# Altium footprint library 6-Connectors-3.PcbLib: 153 footprints (part 9 of 11) (continued)
## TYCO_350711-1 [mm] "6 Circuits Mini-Universal MATE-N-LOK Connector" (continued)
  text "1" at -11.055,-3.765 h1.2
  text "4" at -11.605,2.61 h1.2
  text "6" at 10.78,2.64 h1.2
  text "3" at 10.78,-3.71 h1.2
3D body "TYCO_350711-1.stp": height 14.82, standoff -3.56, extent -11.43,-9.525 11.43,9.525

## TYCO_350712-1 [mm] "9 Circuits Mini-Universal MATE-N-LOK Connector"
height 14.73
pads (9):
  round 2.5 hole 1.8: 1(-6.35,6.35) 2(-6.35,0) 3(-6.35,-6.35) 4(0,6.35) 5(0,0) 6(0,-6.35) 7(6.35,6.35) 8(6.35,0) 9(6.35,-6.35)
Top Overlay:
  circle w0.2: c-6.35,0.032 r3.016
  circle w0.2: c6.35,6.382 r3.016
  circle w0.2: c6.35,-6.318 r3.016
  circle w0.2: c0,-6.318 r3.016
  circle w0.2: c0,0.032 r3.016
  circle w0.2: c0,6.382 r3.016
  lines w0.2: -10.16,-1.956 -12.7,-1.956 -12.7,1.981 -10.16,1.981 ; 10.16,-1.981 12.7,-1.981 12.7,1.956 10.16,1.956 ; -10.16,-11.43 -8.89,-11.43 -8.89,-10.16 -3.81,-10.16 -3.81,-11.43 -2.54,-11.43 -2.54,-10.16 2.54,-10.16 2.54,-11.43 3.81,-11.43 3.81,-10.16 8.89,-10.16 8.89,-11.43 10.16,-11.43 10.16,11.43 8.89,11.43 8.89,10.16 3.81,10.16 3.81,11.43 2.54,11.43 2.54,10.16 -2.54,10.16 -2.54,11.43 -3.81,11.43 -3.81,10.16 -8.89,10.16 -8.89,11.43 -10.16,11.43 -10.16,-11.43 ; -9.335,-9.335 -6.35,-9.335 ccw(c-6.35,-6.35) -6.35,-3.366 -9.335,-3.366 -9.335,-9.335 ; -9.335,3.366 -6.35,3.366 ccw(c-6.35,6.35) -6.35,9.334 -9.334,9.335 -9.335,3.366 ; 6.35,-2.984 cw(c6.35,0) 6.35,2.984 9.335,2.984 9.335,-2.985 6.35,-2.984
  text "9" at 6.765,-11.27 h1.02
  text "3" at -5.935,-11.27 h1.02
  text "6" at 0.465,-11.27 h1.02
  text "1" at -5.885,10.63 h1.02
  text "4" at 0.465,10.63 h1.02
  text "7" at 6.773,10.627 h1.02
Mechanical 8:
  lines w0.1: -7.35,-6.35 -6.35,-6.35 ; -7.35,0 -6.35,0 ; -7.35,6.35 -6.35,6.35 ; -6.35,-7.35 -6.35,-6.35 ; -6.35,-5.35 -6.35,-6.35 ; -6.35,-1 -6.35,0 ; -6.35,1 -6.35,0 ; -6.35,5.35 -6.35,6.35 ; -6.35,7.35 -6.35,6.35 ; -5.35,-6.35 -6.35,-6.35 ; -5.35,0 -6.35,0 ; -5.35,6.35 -6.35,6.35 ; -1,-6.35 0,-6.35 ; -1,0 0,0 ; -1,6.35 0,6.35 ; 0,-7.35 0,-6.35 ; 0,-5.35 0,-6.35 ; 0,-1 0,0 ; 0,1 0,0 ; 0,5.35 0,6.35 ; 0,7.35 0,6.35 ; 1,-6.35 0,-6.35 ; 1,0 0,0 ; 1,6.35 0,6.35 ; 5.35,-6.35 6.35,-6.35 ; 5.35,0 6.35,0 ; 5.35,6.35 6.35,6.35 ; 6.35,-7.35 6.35,-6.35 ; 6.35,-5.35 6.35,-6.35 ; 6.35,-1 6.35,0 ; 6.35,1 6.35,0 ; 6.35,5.35 6.35,6.35 ; 6.35,7.35 6.35,6.35 ; 7.35,-6.35 6.35,-6.35 ; 7.35,0 6.35,0 ; 7.35,6.35 6.35,6.35
Mechanical 14:
  circle w0.1: c-6.35,0.032 r3.016
  circle w0.1: c6.35,6.382 r3.016
  circle w0.1: c6.35,-6.318 r3.016
  circle w0.1: c0,-6.318 r3.016
  circle w0.1: c0,0.032 r3.016
  circle w0.1: c0,6.382 r3.016
  lines w0.1: -10.16,-1.956 -12.7,-1.956 -12.7,1.981 -10.16,1.981 ; 10.16,-1.981 12.7,-1.981 12.7,1.956 10.16,1.956 ; -10.16,-11.43 -8.89,-11.43 -8.89,-10.16 -3.81,-10.16 -3.81,-11.43 -2.54,-11.43 -2.54,-10.16 2.54,-10.16 2.54,-11.43 3.81,-11.43 3.81,-10.16 8.89,-10.16 8.89,-11.43 10.16,-11.43 10.16,11.43 8.89,11.43 8.89,10.16 3.81,10.16 3.81,11.43 2.54,11.43 2.54,10.16 -2.54,10.16 -2.54,11.43 -3.81,11.43 -3.81,10.16 -8.89,10.16 -8.89,11.43 -10.16,11.43 -10.16,-11.43 ; -9.335,-9.335 -6.35,-9.335 ccw(c-6.35,-6.35) -6.35,-3.366 -9.335,-3.366 -9.335,-9.335 ; -9.335,3.366 -6.35,3.366 ccw(c-6.35,6.35) -6.35,9.334 -9.334,9.335 -9.335,3.366 ; 6.35,-2.984 cw(c6.35,0) 6.35,2.984 9.335,2.984 9.335,-2.985 6.35,-2.984
  text "9" at 6.765,-11.27 h1.02
  text "3" at -5.935,-11.27 h1.02
  text "6" at 0.465,-11.27 h1.02
  text "1" at -5.885,10.63 h1.02
  text "4" at 0.465,10.63 h1.02
  text "7" at 6.773,10.627 h1.02
3D body "TYCO_350712-1.stp": height 14.82, standoff -3.56, extent -12.7,-11.43 12.7,11.43

## TYCO_350713-1 [mm] "12 Circuits Mini-Universal MATE-N-LOK Connector"
height 14.73
pads (12):
  round 2.5 hole 1.8: 1(-9.525,6.35) 2(-9.525,0) 3(-9.525,-6.35) 4(-3.175,6.35) 5(-3.175,0) 6(-3.175,-6.35) 7(3.175,6.35) 8(3.175,0) 9(3.175,-6.35) 10(9.525,6.35) 11(9.525,0) 12(9.525,-6.35)
Top Overlay:
  circle w0.2: c9.525,-6.35 r2.984
  circle w0.2: c9.525,6.35 r2.984
  circle w0.2: c3.175,6.35 r2.984
  circle w0.2: c3.175,0 r2.984
  circle w0.2: c3.175,-6.35 r2.984
  circle w0.2: c-3.175,-6.35 r2.984
  circle w0.2: c-3.175,0 r2.984
  circle w0.2: c-3.175,6.35 r2.984
  circle w0.2: c-9.525,0 r2.984
  lines w0.2: -13.335,-10.16 13.335,-10.16 ; -13.335,-1.981 -15.875,-1.981 -15.875,1.956 -13.335,1.956 ; -13.335,10.16 13.335,10.16 ; -12.065,-10.16 -12.065,-11.43 -13.335,-11.43 -13.335,11.43 -12.065,11.43 -12.065,10.16 ; -6.985,-10.16 -6.985,-11.43 -5.715,-11.43 -5.715,-10.16 ; -6.985,10.16 -6.985,11.43 -5.715,11.43 -5.715,10.16 ; -0.635,-10.16 -0.635,-11.43 0.635,-11.43 0.635,-10.16 ; -0.635,10.16 -0.635,11.43 0.635,11.43 0.635,10.16 ; 5.715,-10.16 5.715,-11.43 6.985,-11.43 6.985,-10.16 ; 5.715,10.16 5.715,11.43 6.985,11.43 6.985,10.16 ; 12.065,-10.16 12.065,-11.43 13.335,-11.43 13.335,11.43 12.065,11.43 12.065,10.16 ; 13.335,-1.981 15.875,-1.981 15.875,1.956 13.335,1.956 ; -12.51,-9.335 -12.51,-3.366 -9.525,-3.366 cw(c-9.525,-6.35) -9.525,-9.334 -12.51,-9.335 ; -12.51,3.366 -9.525,3.366 ccw(c-9.525,6.35) -9.525,9.334 -12.51,9.335 -12.51,3.366 ; 9.525,-2.984 cw(c9.525,0) 9.525,2.984 12.51,2.985 12.51,-2.985 9.525,-2.984
  text "10" at 9.948,10.652 h1.02
  text "12" at 9.94,-12.17 h1.02
  text "7" at 3.598,10.627 h1.02
  text "4" at -2.71,10.63 h1.02
  text "1" at -9.06,10.63 h1.02
  text "6" at -2.71,-11.27 h1.02
  text "3" at -9.11,-11.27 h1.02
  text "9" at 3.59,-11.27 h1.02
Mechanical 8:
  lines w0.1: -10.025,-6.35 -9.525,-6.35 ; -10.025,0 -9.525,0 ; -10.025,6.35 -9.525,6.35 ; -9.525,-6.85 -9.525,-6.35 ; -9.525,-5.85 -9.525,-6.35 ; -9.525,-0.5 -9.525,0 ; -9.525,0.5 -9.525,0 ; -9.525,5.85 -9.525,6.35 ; -9.525,6.85 -9.525,6.35 ; -9.025,-6.35 -9.525,-6.35 ; -9.025,0 -9.525,0 ; -9.025,6.35 -9.525,6.35 ; -3.675,-6.35 -3.175,-6.35 ; -3.675,0 -3.175,0 ; -3.675,6.35 -3.175,6.35 ; -3.175,-6.85 -3.175,-6.35 ; -3.175,-5.85 -3.175,-6.35 ; -3.175,-0.5 -3.175,0 ; -3.175,0.5 -3.175,0 ; -3.175,5.85 -3.175,6.35 ; -3.175,6.85 -3.175,6.35 ; -2.675,-6.35 -3.175,-6.35 ; -2.675,0 -3.175,0 ; -2.675,6.35 -3.175,6.35 ; -0.5,0 0,0 ; 0,-0.5 0,0 ; 0,0.5 0,0 ; 0.5,0 0,0 ; 2.675,-6.35 3.175,-6.35 ; 2.675,0 3.175,0 ; 2.675,6.35 3.175,6.35 ; 3.175,-6.85 3.175,-6.35 ; 3.175,-5.85 3.175,-6.35 ; 3.175,-0.5 3.175,0 ; 3.175,0.5 3.175,0 ; 3.175,5.85 3.175,6.35 ; 3.175,6.85 3.175,6.35 ; 3.675,-6.35 3.175,-6.35 ; 3.675,0 3.175,0 ; 3.675,6.35 3.175,6.35 ; 9.025,-6.35 9.525,-6.35 ; 9.025,0 9.525,0 ; 9.025,6.35 9.525,6.35 ; 9.525,-6.85 9.525,-6.35 ; 9.525,-5.85 9.525,-6.35 ; 9.525,-0.5 9.525,0 ; 9.525,0.5 9.525,0 ; 9.525,5.85 9.525,6.35 ; 9.525,6.85 9.525,6.35 ; 10.025,-6.35 9.525,-6.35 ; 10.025,0 9.525,0 ; 10.025,6.35 9.525,6.35
Mechanical 14:
  circle w0.1: c9.525,-6.35 r2.984
  circle w0.1: c9.525,6.35 r2.984
  circle w0.1: c3.175,6.35 r2.984
  circle w0.1: c3.175,0 r2.984
  circle w0.1: c3.175,-6.35 r2.984
  circle w0.1: c-3.175,-6.35 r2.984
  circle w0.1: c-3.175,0 r2.984
  circle w0.1: c-3.175,6.35 r2.984
  circle w0.1: c-9.525,0 r2.984
  lines w0.1: -13.335,-10.16 13.335,-10.16 ; -13.335,-1.981 -15.875,-1.981 -15.875,1.956 -13.335,1.956 ; -13.335,10.16 13.335,10.16 ; -12.065,-10.16 -12.065,-11.43 -13.335,-11.43 -13.335,11.43 -12.065,11.43 -12.065,10.16 ; -6.985,-10.16 -6.985,-11.43 -5.715,-11.43 -5.715,-10.16 ; -6.985,10.16 -6.985,11.43 -5.715,11.43 -5.715,10.16 ; -0.635,-10.16 -0.635,-11.43 0.635,-11.43 0.635,-10.16 ; -0.635,10.16 -0.635,11.43 0.635,11.43 0.635,10.16 ; 5.715,-10.16 5.715,-11.43 6.985,-11.43 6.985,-10.16 ; 5.715,10.16 5.715,11.43 6.985,11.43 6.985,10.16 ; 12.065,-10.16 12.065,-11.43 13.335,-11.43 13.335,11.43 12.065,11.43 12.065,10.16 ; 13.335,-1.981 15.875,-1.981 15.875,1.956 13.335,1.956 ; -12.51,-9.335 -12.51,-3.366 -9.525,-3.366 cw(c-9.525,-6.35) -9.525,-9.334 -12.51,-9.335 ; -12.51,3.366 -9.525,3.366 ccw(c-9.525,6.35) -9.525,9.334 -12.51,9.335 -12.51,3.366 ; 9.525,-2.984 cw(c9.525,0) 9.525,2.984 12.51,2.985 12.51,-2.985 9.525,-2.984
  text "10" at 9.948,10.652 h1.02
  text "12" at 9.94,-12.17 h1.02
  text "7" at 3.598,10.627 h1.02
  text "4" at -2.71,10.63 h1.02
  text "1" at -9.06,10.63 h1.02
  text "6" at -2.71,-11.27 h1.02
  text "3" at -9.11,-11.27 h1.02
  text "9" at 3.59,-11.27 h1.02
3D body "TYCO_350713-1.stp": height 14.82, standoff -3.56, extent -15.875,-11.43 15.875,11.43

## TYCO_350786-1 [mm] "2 Circuits In-Line - Mini-Universal MATE-N-LOK Connector"
height 14.73
pads (2):
  round 2.5 hole 1.8: 1(-3.175,0) 2(3.175,0)
Top Overlay:
  lines w0.2: -7.325,-1.27 -7.325,1.27 ; -5.715,-3.81 -5.715,-5.08 -6.985,-5.08 -6.985,-3.81 ; -0.635,-3.81 -0.635,-5.08 0.635,-5.08 0.635,-3.81 ; 5.715,-3.81 5.715,-5.08 6.985,-5.08 6.985,-3.81 ; 7.325,-1.27 7.325,1.27 ; -6.985,-3.81 -6.985,-1.27 -9.525,-1.27 -9.525,1.27 -6.985,1.27 -6.985,3.81 6.985,3.81 6.985,1.27 9.525,1.27 9.525,-1.27 6.985,-1.27 6.985,-3.81 ; -6.985,-3.81 6.985,-3.81 ; -6.16,-2.985 -6.159,0 cw(c-3.175,0) -0.191,0 -0.191,-2.985 ; -6.16,-2.985 -0.191,-2.985 ; -6.16,-2.985 -5.779,-2.604 ; -5.779,-2.604 -0.572,-2.604 ; -5.779,-2.604 -5.779,0 cw(c-3.175,0) -0.572,0 -0.572,-2.604 ; -0.572,-2.604 -0.191,-2.985 ; 0.191,-2.985 0.191,0 cw(c3.175,0) 6.159,0 6.16,-2.985 ; 0.191,-2.985 6.16,-2.985 ; 0.191,-2.985 0.572,-2.604 ; 0.572,-2.604 5.779,-2.604 ; 0.572,-2.604 0.572,0 cw(c3.175,0) 5.779,0 5.779,-2.604 ; 5.779,-2.604 6.16,-2.985
  text "1" at -2.54,-4.68 h1.02
  text "2" at 3.81,-4.905 h1.02
Mechanical 8:
  lines w0.1: -1,0 0,0 0,-1
Mechanical 14:
  lines w0.1: -7.325,-1.27 -7.325,1.27 ; -5.715,-3.81 -5.715,-5.08 -6.985,-5.08 -6.985,-3.81 ; -0.635,-3.81 -0.635,-5.08 0.635,-5.08 0.635,-3.81 ; 5.715,-3.81 5.715,-5.08 6.985,-5.08 6.985,-3.81 ; 7.325,-1.27 7.325,1.27 ; -6.985,-3.81 -6.985,-1.27 -9.525,-1.27 -9.525,1.27 -6.985,1.27 -6.985,3.81 6.985,3.81 6.985,1.27 9.525,1.27 9.525,-1.27 6.985,-1.27 6.985,-3.81 ; -6.985,-3.81 6.985,-3.81 ; -6.16,-2.985 -6.159,0 cw(c-3.175,0) -0.191,0 -0.191,-2.985 ; -6.16,-2.985 -0.191,-2.985 ; -6.16,-2.985 -5.779,-2.604 ; -5.779,-2.604 -0.572,-2.604 ; -5.779,-2.604 -5.779,0 cw(c-3.175,0) -0.572,0 -0.572,-2.604 ; -0.572,-2.604 -0.191,-2.985 ; 0.191,-2.985 0.191,0 cw(c3.175,0) 6.159,0 6.16,-2.985 ; 0.191,-2.985 6.16,-2.985 ; 0.191,-2.985 0.572,-2.604 ; 0.572,-2.604 5.779,-2.604 ; 0.572,-2.604 0.572,0 cw(c3.175,0) 5.779,0 5.779,-2.604 ; 5.779,-2.604 6.16,-2.985
  text "1" at -2.54,-4.68 h1.02
  text "2" at 3.81,-4.905 h1.02
3D body "TYCO_350786-1.stp": height 14.82, standoff -3.56, extent -9.525,-5.08 9.525,3.81

## TYCO_350789-1 [mm] "3 Circuits In-Line - Mini-Universal MATE-N-LOK Connector"
height 14.73
pads (3):
  round 2.5 hole 1.8: 1(-6.35,0) 2(0,0) 3(6.35,0)
Top Overlay:
  circle w0.2: c0,0 r2.604
  circle w0.2: c0,0 r2.984
  lines w0.2: -10.5,-1.27 -10.5,1.27 ; -8.89,-3.81 -8.89,-5.08 -10.16,-5.08 -10.16,-3.81 ; -3.81,-3.81 -3.81,-5.08 -2.54,-5.08 -2.54,-3.81 ; 2.54,-3.81 2.54,-5.08 3.81,-5.08 3.81,-3.81 ; 8.91,-3.81 8.89,-5.08 10.16,-5.08 10.16,-3.81 ; 10.5,-1.27 10.5,1.27 ; -10.16,-3.81 10.16,-3.81 ; -10.16,-3.81 -10.16,-1.27 -12.7,-1.27 -12.7,1.27 -10.16,1.27 -10.16,3.81 10.16,3.81 10.16,1.27 12.7,1.27 12.7,-1.27 10.16,-1.27 10.16,-3.81 ; -9.335,-2.985 -3.366,-2.985 ; -9.335,-2.985 -9.334,0 cw(c-6.35,0) -3.366,0 -3.366,-2.985 ; -9.335,-2.985 -8.954,-2.604 ; -8.954,-2.604 -3.747,-2.604 ; -8.954,-2.604 -8.954,0 cw(c-6.35,0) -3.746,0 -3.747,-2.604 ; -3.747,-2.604 -3.366,-2.985 ; 3.366,-2.985 3.366,0 cw(c6.35,0) 9.334,0 9.335,-2.985 ; 3.366,-2.985 9.335,-2.985 ; 3.366,-2.985 3.747,-2.604 ; 3.747,-2.604 8.954,-2.604 ; 3.747,-2.604 3.747,0 cw(c6.35,0) 8.954,0 8.954,-2.604 ; 8.954,-2.604 9.335,-2.985
  text "1" at -5.715,-5.08 h1.02
  text "2" at 0.635,-5.08 h1.02
  text "3" at 6.985,-5.08 h1.02
Mechanical 14:
  circle w0.1: c0,0 r2.604
  circle w0.1: c0,0 r2.984
  lines w0.1: -10.5,-1.27 -10.5,1.27 ; -8.89,-3.81 -8.89,-5.08 -10.16,-5.08 -10.16,-3.81 ; -3.81,-3.81 -3.81,-5.08 -2.54,-5.08 -2.54,-3.81 ; 2.54,-3.81 2.54,-5.08 3.81,-5.08 3.81,-3.81 ; 8.91,-3.81 8.89,-5.08 10.16,-5.08 10.16,-3.81 ; 10.5,-1.27 10.5,1.27 ; -10.16,-3.81 10.16,-3.81 ; -10.16,-3.81 -10.16,-1.27 -12.7,-1.27 -12.7,1.27 -10.16,1.27 -10.16,3.81 10.16,3.81 10.16,1.27 12.7,1.27 12.7,-1.27 10.16,-1.27 10.16,-3.81 ; -9.335,-2.985 -3.366,-2.985 ; -9.335,-2.985 -9.334,0 cw(c-6.35,0) -3.366,0 -3.366,-2.985 ; -9.335,-2.985 -8.954,-2.604 ; -8.954,-2.604 -3.747,-2.604 ; -8.954,-2.604 -8.954,0 cw(c-6.35,0) -3.746,0 -3.747,-2.604 ; -3.747,-2.604 -3.366,-2.985 ; 3.366,-2.985 3.366,0 cw(c6.35,0) 9.334,0 9.335,-2.985 ; 3.366,-2.985 9.335,-2.985 ; 3.366,-2.985 3.747,-2.604 ; 3.747,-2.604 8.954,-2.604 ; 3.747,-2.604 3.747,0 cw(c6.35,0) 8.954,0 8.954,-2.604 ; 8.954,-2.604 9.335,-2.985
  text "1" at -5.715,-5.08 h1.02
  text "2" at 0.635,-5.08 h1.02
  text "3" at 6.985,-5.08 h1.02
3D body "TYCO_350789-1.stp": height 14.82, standoff -3.56, extent -12.7,-5.08 12.7,3.81

## TYCO_350792-1 [mm] "4 Circuits In-Line - Mini-Universal MATE-N-LOK Connector"
height 14.73
pads (4):
  round 2.5 hole 1.8: 1(-9.525,0) 2(-3.175,0) 3(3.175,0) 4(9.525,0)
Top Overlay:
  circle w0.2: c-3.175,0 r2.604
  circle w0.2: c3.175,0 r2.604
  circle w0.2: c-3.175,0 r2.984
  circle w0.2: c3.175,0 r2.984
  lines w0.2: -13.675,-1.27 -13.675,1.27 ; -12.065,-3.81 -12.065,-5.08 -13.335,-5.08 -13.335,-3.81 ; -6.985,-3.81 -6.985,-5.08 -5.715,-5.08 -5.715,-3.81 ; -0.635,-3.81 -0.635,-5.08 0.635,-5.08 0.635,-3.81 ; 5.715,-3.81 5.715,-5.08 6.985,-5.08 6.985,-3.81 ; 12.065,-3.81 12.065,-5.08 13.335,-5.08 13.335,-3.81 ; 13.675,-1.27 13.675,1.27 ; -13.335,-3.81 -13.335,-1.27 -15.875,-1.27 -15.875,1.27 -13.335,1.27 -13.335,3.81 13.335,3.81 13.335,1.27 15.875,1.27 15.875,-1.27 13.335,-1.27 13.335,-3.81 ; -13.335,-3.81 13.335,-3.81 ; -12.51,-2.985 -12.509,0 cw(c-9.525,0) -6.541,0 -6.541,-2.985 ; -12.51,-2.985 -6.541,-2.985 ; -12.51,-2.985 -12.129,-2.604 ; -12.129,-2.604 -6.922,-2.604 ; -12.129,-2.604 -12.129,0 cw(c-9.525,0) -6.922,0 -6.922,-2.604 ; -6.922,-2.604 -6.541,-2.985 ; 6.541,-2.985 6.541,0 cw(c9.525,0) 12.509,0 12.51,-2.985 ; 6.541,-2.985 12.51,-2.985 ; 6.541,-2.985 6.922,-2.604 ; 6.922,-2.604 6.922,0 cw(c9.525,0) 12.129,0 12.129,-2.604 ; 6.922,-2.604 12.129,-2.604 ; 12.129,-2.604 12.51,-2.985
  text "4" at 10.16,-5.08 h1.02
  text "3" at 3.81,-5.08 h1.02
  text "2" at -2.54,-5.08 h1.02
  text "1" at -8.89,-5.08 h1.02
Mechanical 8:
  lines w0.1: -1,0 0,0 0,-1
Mechanical 14:
  circle w0.1: c-3.175,0 r2.604
  circle w0.1: c3.175,0 r2.604
  circle w0.1: c-3.175,0 r2.984
  circle w0.1: c3.175,0 r2.984
  lines w0.1: -13.675,-1.27 -13.675,1.27 ; -12.065,-3.81 -12.065,-5.08 -13.335,-5.08 -13.335,-3.81 ; -6.985,-3.81 -6.985,-5.08 -5.715,-5.08 -5.715,-3.81 ; -0.635,-3.81 -0.635,-5.08 0.635,-5.08 0.635,-3.81 ; 5.715,-3.81 5.715,-5.08 6.985,-5.08 6.985,-3.81 ; 12.065,-3.81 12.065,-5.08 13.335,-5.08 13.335,-3.81 ; 13.675,-1.27 13.675,1.27 ; -13.335,-3.81 -13.335,-1.27 -15.875,-1.27 -15.875,1.27 -13.335,1.27 -13.335,3.81 13.335,3.81 13.335,1.27 15.875,1.27 15.875,-1.27 13.335,-1.27 13.335,-3.81 ; -13.335,-3.81 13.335,-3.81 ; -12.51,-2.985 -6.541,-2.985 ; -12.51,-2.985 -12.509,0 cw(c-9.525,0) -6.541,0 -6.541,-2.985 ; -12.51,-2.985 -12.129,-2.604 ; -12.129,-2.604 -6.922,-2.604 ; -12.129,-2.604 -12.129,0 cw(c-9.525,0) -6.922,0 -6.922,-2.604 ; -6.922,-2.604 -6.541,-2.985 ; 6.541,-2.985 12.51,-2.985 ; 6.541,-2.985 6.541,0 cw(c9.525,0) 12.509,0 12.51,-2.985 ; 6.541,-2.985 6.922,-2.604 ; 6.922,-2.604 6.922,0 cw(c9.525,0) 12.129,0 12.129,-2.604 ; 6.922,-2.604 12.129,-2.604 ; 12.129,-2.604 12.51,-2.985
  text "4" at 10.16,-5.08 h1.02
  text "3" at 3.81,-5.08 h1.02
  text "2" at -2.54,-5.08 h1.02
  text "1" at -8.89,-5.08 h1.02
3D body "TYCO_350792-1.stp": height 14.82, standoff -3.56, extent -15.875,-5.08 15.875,3.81

## TYCO_640453-2 [mm] "2 Circuits, 2.54mm (.100\") Pitch,Single Row Right Angle Header, Type  MTA-100"
height 4.76
pads (2):
  round 1.7 hole 1: 1(-1.27,0.002) 2(1.27,-0.002)
Top Overlay:
  lines w0.2: -1.587,1.105 -1.587,10.033 -0.953,10.033 -0.953,1.105 ; -1.587,2.54 -2.54,2.54 -2.54,-2.54 2.54,-2.54 2.54,2.54 1.587,2.54 ; -0.953,2.54 0.953,2.54 ; 0.953,1.105 0.953,10.033 1.587,10.033 1.587,1.105
  text "1" at -3.19,-0.503 h1
Mechanical 8:
  lines w0.1: -2.27,0 -1.27,0 ; -1.27,-1 -1.27,0 ; -1.27,1 -1.27,0 ; -1,0 0,0 ; -0.27,0 -1.27,0 ; 0,-1 0,0 ; 0,1 0,0 ; 0.27,0 1.27,0 ; 1,0 0,0 ; 1.27,-1 1.27,0 ; 1.27,1 1.27,0 ; 2.27,0 1.27,0
Mechanical 14:
  lines w0.1: -1.587,2.54 -2.54,2.54 -2.54,-2.54 2.54,-2.54 2.54,2.54 1.587,2.54 ; -0.953,2.54 0.953,2.54 ; -1.587,-0.318 -0.953,-0.318 -0.953,10.033 -1.587,10.033 -1.587,-0.318 ; 0.953,-0.312 0.953,10.033 1.587,10.033 1.587,-0.312 0.953,-0.312
  text "1" at -3.19,-0.503 h1
3D body "TYCO_640453-2.stp": height 4.43, standoff -3.56, extent -2.54,-2.54 2.54,10.033

## TYCO_640900-1 [mm] "5 Circuits In-Line - Mini-Universal MATE-N-LOK Connector"
height 14.73
pads (5):
  round 2.5 hole 1.8: 1(-12.7,0) 2(-6.35,0) 3(0,0) 4(6.35,0) 5(12.7,0)
Top Overlay:
  circle w0.2: c-6.35,0 r2.984
  circle w0.2: c-6.35,0 r2.604
  circle w0.2: c0,0 r2.604
  circle w0.2: c0,0 r2.984
  circle w0.2: c6.35,0 r2.604
  circle w0.2: c6.35,0 r2.984
  lines w0.2: -16.85,-1.27 -16.85,1.27 ; -15.24,-3.81 -15.24,-5.08 -16.51,-5.08 -16.51,-3.81 ; -10.16,-3.81 -10.16,-5.08 -8.89,-5.08 -8.89,-3.81 ; -3.81,-3.81 -3.81,-5.08 -2.54,-5.08 -2.54,-3.81 ; 2.54,-3.81 2.54,-5.08 3.81,-5.08 3.81,-3.81 ; 8.89,-3.81 8.89,-5.08 10.16,-5.08 10.16,-3.81 ; 15.24,-3.81 15.24,-5.08 16.51,-5.08 16.51,-3.81 ; 16.85,-1.27 16.85,1.27 ; -16.51,-3.81 16.51,-3.81 ; -16.51,-3.81 -16.51,-1.27 -19.05,-1.27 -19.05,1.27 -16.51,1.27 -16.51,3.81 16.51,3.81 16.51,1.27 19.05,1.27 19.05,-1.27 16.51,-1.27 16.51,-3.81 ; -15.685,-2.985 -9.716,-2.985 ; -15.685,-2.985 -15.684,0 cw(c-12.7,0) -9.716,0 -9.716,-2.985 ; -15.685,-2.985 -15.304,-2.604 ; -15.304,-2.604 -10.097,-2.604 ; -15.304,-2.604 -15.304,0 cw(c-12.7,0) -10.097,0 -10.097,-2.604 ; -10.097,-2.604 -9.716,-2.985 ; 9.716,-2.985 9.716,0 cw(c12.7,0) 15.684,0 15.685,-2.985 ; 9.716,-2.985 15.685,-2.985 ; 9.716,-2.985 10.097,-2.604 ; 10.097,-2.604 10.097,0 cw(c12.7,0) 15.304,0 15.304,-2.604 ; 10.097,-2.604 15.304,-2.604 ; 15.304,-2.604 15.685,-2.985
  text "1" at -12.065,-5.08 h1.02
  text "2" at -5.715,-5.08 h1.02
  text "3" at 0.635,-5.08 h1.02
  text "4" at 6.985,-5.08 h1.02
  text "5" at 13.335,-5.08 h1.02
Mechanical 14:
  circle w0.1: c-6.35,0 r2.984
  circle w0.1: c-6.35,0 r2.604
  circle w0.1: c0,0 r2.604
  circle w0.1: c0,0 r2.984
  circle w0.1: c6.35,0 r2.604
  circle w0.1: c6.35,0 r2.984
  lines w0.1: -16.85,-1.27 -16.85,1.27 ; -15.24,-3.81 -15.24,-5.08 -16.51,-5.08 -16.51,-3.81 ; -10.16,-3.81 -10.16,-5.08 -8.89,-5.08 -8.89,-3.81 ; -3.81,-3.81 -3.81,-5.08 -2.54,-5.08 -2.54,-3.81 ; 2.54,-3.81 2.54,-5.08 3.81,-5.08 3.81,-3.81 ; 8.89,-3.81 8.89,-5.08 10.16,-5.08 10.16,-3.81 ; 15.24,-3.81 15.24,-5.08 16.51,-5.08 16.51,-3.81 ; 16.85,-1.27 16.85,1.27 ; -16.51,-3.81 16.51,-3.81 ; -16.51,-3.81 -16.51,-1.27 -19.05,-1.27 -19.05,1.27 -16.51,1.27 -16.51,3.81 16.51,3.81 16.51,1.27 19.05,1.27 19.05,-1.27 16.51,-1.27 16.51,-3.81 ; -15.685,-2.985 -9.716,-2.985 ; -15.685,-2.985 -15.684,0 cw(c-12.7,0) -9.716,0 -9.716,-2.985 ; -15.685,-2.985 -15.304,-2.604 ; -15.304,-2.604 -10.097,-2.604 ; -15.304,-2.604 -15.304,0 cw(c-12.7,0) -10.097,0 -10.097,-2.604 ; -10.097,-2.604 -9.716,-2.985 ; 9.716,-2.985 9.716,0 cw(c12.7,0) 15.684,0 15.685,-2.985 ; 9.716,-2.985 15.685,-2.985 ; 9.716,-2.985 10.097,-2.604 ; 10.097,-2.604 10.097,0 cw(c12.7,0) 15.304,0 15.304,-2.604 ; 10.097,-2.604 15.304,-2.604 ; 15.304,-2.604 15.685,-2.985
  text "1" at -12.065,-5.08 h1.02
  text "2" at -5.715,-5.08 h1.02
  text "3" at 0.635,-5.08 h1.02
  text "4" at 6.985,-5.08 h1.02
  text "5" at 13.335,-5.08 h1.02
3D body "TYCO_640900-1.stp": height 14.82, standoff -3.56, extent -19.05,-5.08 19.05,3.81

## TYCO_725963-2 [mm] "Right Angle FASTON TAB 2.8 x 0.8mm"
height 6
pads (2):
  round 2.1 hole 1.4: 1(-2.5,0) 1(2.5,0)
Top Overlay:
  lines w0.2: -3.7,-0.4 -10.245,-0.4 -10.245,0.4 -3.7,0.4 ; -1.3,-0.4 1.3,-0.4 ; -1.3,0.4 1.3,0.4
Mechanical 8:
  lines w0.1: -3.5,0 -2.5,0 ; -2.5,-1 -2.5,0 ; -2.5,1 -2.5,0 ; -1.5,0 -2.5,0 ; -1,0 0,0 ; 0,-1 0,0 ; 0,1 0,0 ; 1,0 0,0 ; 1.5,0 2.5,0 ; 2.5,-1 2.5,0 ; 2.5,1 2.5,0 ; 3.5,0 2.5,0
Mechanical 14:
  lines w0.1: -9.845,-0.4 -9.845,0.4 ; 0.655,-0.4 0.655,0.4 ; -10.245,-0.4 -10.245,0.4 3.155,0.4 3.155,-0.4 -10.245,-0.4
3D body "v240-170.stp": height 0.02, standoff -1.65, extent 1.3,-1.2 3.7,1.2
3D body "v240-170.stp": height 0.02, standoff -1.65, extent -3.7,-1.2 -1.3,1.2
3D body "TYCO_725963-2.stp": height 6, standoff -2, extent -10.245,-0.4 3.155,0.4

## WAGO_236-402 [mm] "16A 250VAC 2 Way PCB Terminal Block, Pitch 5mm, CAGE CLAMP?Connection, Wire Size Max: 2.5mm²"
height 13
pads (4):
  round 1.8 hole 1.1: 1(-2.5,-2.5) 1(-2.5,2.5) 2(2.5,-2.5) 2(2.5,2.5)
Top Overlay:
  lines w0.2: -5.4,-5.34 -6,-5.34 -6,-4.14 -5.4,-4.14 ; -5.4,-1.51 -6,-1.51 -6,0.09 -5.4,0.09 ; -5.4,0.77 5.6,0.77 ; -5.4,1.256 5.6,1.256 0.6,1.256 1.1,1.256 ; -5.4,2.76 -3.723,2.76 ; -5.4,3.582 -6,3.582 -6,5.182 -5.4,5.182 ; -5.4,5.905 -6,5.905 -6,7.101 -5.4,7.101 ; -4.4,-2.937 -3.962,-2.937 ; -3.7,-0.745 -0.1,-0.745 ; -3.7,0.21 -0.1,0.21 ; -3.671,-2.937 -3.962,-2.937 ; -3.5,-3.25 -3.5,-4.245 ; -2.715,3.957 -2.715,6.149 ccw(c-3.215,6.192) -3.008,6.649 ccw(c-3.952,4.735) -3.715,6.857 ; -2.715,5.796 -1.485,5.796 ; -1.485,3.957 -1.485,6.149 cw(c-0.985,6.192) -1.192,6.649 cw(c-0.247,4.735) -0.485,6.857 ; -1.329,-2.937 1.329,-2.937 ; -1.277,2.76 1.277,2.76 ; -1.05,-2.937 -1.05,-4.245 ; 0.106,-2.937 0.2,-3.043 ; 1.038,-2.937 1,-3.043 ; 1.3,-0.745 4.9,-0.745 ; 1.3,0.21 4.9,0.21 ; 1.5,-3.25 1.5,-4.245 ; 2.285,3.957 2.285,6.149 ccw(c1.785,6.192) 1.992,6.649 ccw(c1.048,4.735) 1.285,6.857 ; 2.285,5.796 3.515,5.796 ; 3.515,3.957 3.515,6.149 cw(c4.015,6.192) 3.808,6.649 cw(c4.753,4.735) 4.515,6.857 ; 3.671,-2.937 5.6,-2.937 ; 3.723,2.76 5.6,2.76 ; 3.95,-2.937 3.95,-4.245 ; 5.106,-2.937 5.2,-3.043 ; 5.6,-6.585 -5.4,-6.585 -5.4,7.5 5.6,7.5 5.6,-6.572 ; 5.6,-3.043 5.2,-3.043 ; 5.6,-1.968 6.3,-1.968 6.3,1.412 5.6,1.412 ; 5.6,-0.851 4.9,-0.851 4.9,0.705 1.3,0.705 1.3,-0.851 -0.1,-0.851 -0.1,0.705 -3.7,0.705 -3.7,-0.851 -4.4,-0.851 -4.4,-3.043 -4,-3.043 ; -4,-6.231 -3.5,-4.245 ; -4,-6.231 0.2,-6.231 ; -4,-6.231 -4,-3.043 ; -4,-3.043 -3.962,-2.937 ; -3.715,6.857 -3.715,3.957 -0.485,3.957 -0.485,6.857 ; -3.715,6.857 -0.485,6.857 ; -3.5,-4.245 -1.05,-4.245 ; -1.05,-4.245 0.2,-6.231 ; 0.2,-6.231 0.2,-3.043 ; 0.2,-3.043 1,-3.043 ; 1,-6.231 1.5,-4.245 ; 1,-6.231 5.2,-6.231 ; 1,-6.231 1,-3.043 ; 1.285,6.857 1.285,3.957 4.515,3.957 4.515,6.857 ; 1.285,6.857 4.515,6.857 ; 1.5,-4.245 3.95,-4.245 ; 3.95,-4.245 5.2,-6.231 ; 5.2,-6.231 5.2,-3.043
Mechanical 8:
  lines w0.1: -3.5,-2.5 -2.5,-2.5 ; -3.5,2.5 -2.5,2.5 ; -2.5,-3.5 -2.5,-2.5 ; -2.5,-1.5 -2.5,-2.5 ; -2.5,1.5 -2.5,2.5 ; -2.5,3.5 -2.5,2.5 ; -1.5,-2.5 -2.5,-2.5 ; -1.5,2.5 -2.5,2.5 ; -0.5,0 0,0 ; 0,-0.5 0,0 ; 0,0.5 0,0 ; 0.5,0 0,0 ; 1.5,-2.5 2.5,-2.5 ; 1.5,2.5 2.5,2.5 ; 2.5,-3.5 2.5,-2.5 ; 2.5,-1.5 2.5,-2.5 ; 2.5,1.5 2.5,2.5 ; 2.5,3.5 2.5,2.5 ; 3.5,-2.5 2.5,-2.5 ; 3.5,2.5 2.5,2.5
Mechanical 14:
  lines w0.1: -5.4,-5.34 -6,-5.34 -6,-4.14 -5.4,-4.14 ; -5.4,-1.51 -6,-1.51 -6,0.09 -5.4,0.09 ; -5.4,0.77 5.6,0.77 ; -5.4,1.256 5.6,1.256 0.6,1.256 ; -5.4,2.76 5.6,2.76 ; -5.4,3.582 -6,3.582 -6,5.182 -5.4,5.182 ; -5.4,5.905 -6,5.905 -6,7.101 -5.4,7.101 ; -4.4,-2.937 5.6,-2.937 ; -3.962,-2.937 -4,-3.043 ; -3.7,-0.745 -0.1,-0.745 ; -3.7,0.21 -0.1,0.21 ; -3.5,-2.937 -3.5,-4.245 ; -2.715,3.957 -2.715,6.149 ccw(c-3.215,6.192) -3.008,6.649 ccw(c-3.952,4.735) -3.715,6.857 ; -2.715,5.796 -1.485,5.796 ; -1.485,3.957 -1.485,6.149 cw(c-0.985,6.192) -1.192,6.649 cw(c-0.247,4.735) -0.485,6.857 ; -1.05,-2.937 -1.05,-4.245 ; 0.106,-2.937 0.2,-3.043 ; 1.038,-2.937 1,-3.043 ; 1.3,-0.745 4.9,-0.745 ; 1.3,0.21 4.9,0.21 ; 1.5,-2.937 1.5,-4.245 ; 2.285,3.957 2.285,6.149 ccw(c1.785,6.192) 1.992,6.649 ccw(c1.048,4.735) 1.285,6.857 ; 2.285,5.796 3.515,5.796 ; 3.515,3.957 3.515,6.149 cw(c4.015,6.192) 3.808,6.649 cw(c4.753,4.735) 4.515,6.857 ; 3.95,-2.937 3.95,-4.245 ; 5.106,-2.937 5.2,-3.043 ; 5.6,-6.585 -5.4,-6.585 -5.4,7.5 5.6,7.5 5.6,-6.572 ; 5.6,-3.043 5.2,-3.043 ; 5.6,-1.968 6.3,-1.968 6.3,1.412 5.6,1.412 ; 5.6,-0.851 4.9,-0.851 4.9,0.705 1.3,0.705 1.3,-0.851 -0.1,-0.851 -0.1,0.705 -3.7,0.705 -3.7,-0.851 -4.4,-0.851 -4.4,-3.043 -4,-3.043 ; -4,-6.231 -3.5,-4.245 ; -4,-6.231 0.2,-6.231 ; -4,-6.231 -4,-3.043 ; -3.715,6.857 -3.715,3.957 -0.485,3.957 -0.485,6.857 ; -3.715,6.857 -0.485,6.857 ; -3.5,-4.245 -1.05,-4.245 ; -1.05,-4.245 0.2,-6.231 ; 0.2,-6.231 0.2,-3.043 ; 0.2,-3.043 1,-3.043 ; 1,-6.231 1.5,-4.245 ; 1,-6.231 5.2,-6.231 ; 1,-6.231 1,-3.043 ; 1.285,6.857 1.285,3.957 4.515,3.957 4.515,6.857 ; 1.285,6.857 4.515,6.857 ; 1.5,-4.245 3.95,-4.245 ; 3.95,-4.245 5.2,-6.231 ; 5.2,-6.231 5.2,-3.043
3D body "WAGO_236-402.stp": height 12.71, standoff -4, extent -6,-6.585 6.3,7.5